# Altium integrated library Integrated_Library.IntLib: 173 symbols (part 1 of 2)
Pins are listed as number, name and electrical type; pins without a type are passive.

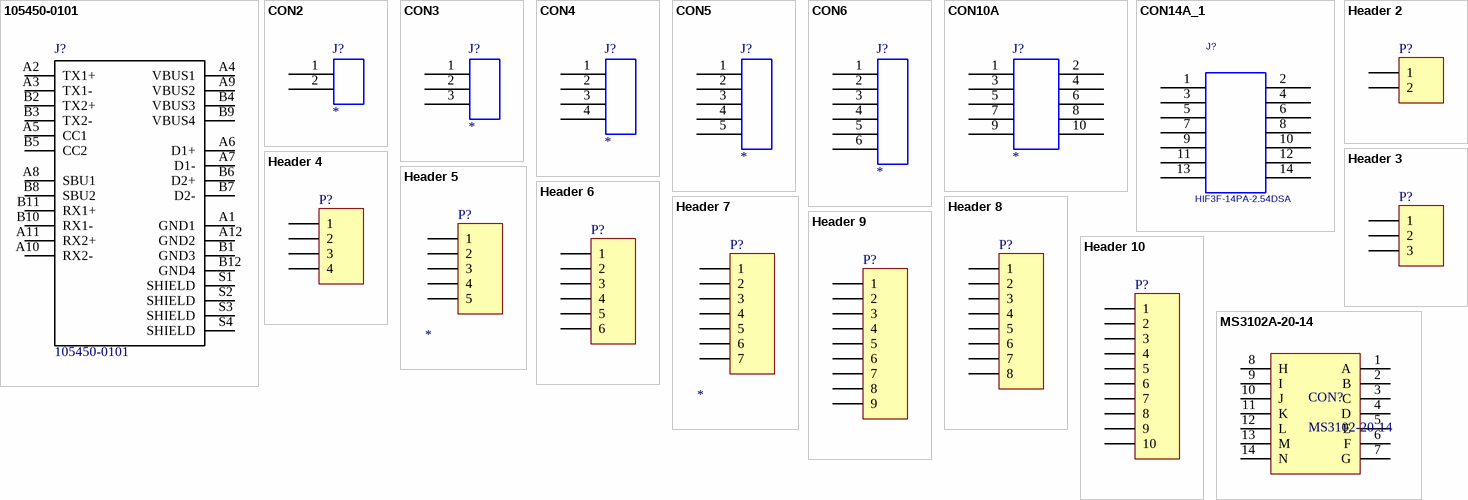
[diagram p0: symbols 105450-0101 to MS3102A-20-14]

## 105450-0101
designator J?
USB Shielded I/O Receptacle; Type C; Right Angle; Surface Mount; Gold over Nickel; MP: 1054500101; MF: Molex; Digi-Key_Purchase_URL: https://www.digikey.kr/product-detail/en/molex/1054500101/WM12856CT-ND/5843891?utm_source=snapeda&utm_medium=aggregator&utm_campaign=symbol; Package: None; SnapEDA_Link: https://www.snapeda.com/parts/1054500101/Molex/view-part/?ref=snap; Digi-Key_Part_Number: WM12856CT-ND; Value: *; Manufacturer: Molex; Part Number: 1054500101
footprint MOLEX_105450-0101_105450-0101(Primary)
pins: A1 GND1, A2 TX1+, A3 TX1-, A4 VBUS1, A5 CC1, A6 D1+, A7 D1-, A8 SBU1, A9 VBUS2, A10 RX2-, A11 RX2+, A12 GND2, B1 GND3, B2 TX2+, B3 TX2-, B4 VBUS3, B5 CC2, B6 D2+, B7 D2-, B8 SBU2, B9 VBUS4, B10 RX1-, B11 RX1+, B12 GND4, S1 SHIELD, S2 SHIELD, S3 SHIELD, S4 SHIELD

## CON2
designator J?
OriginalSymbolOrigin: (0,0)
footprint SMW250-02P
pins: 1, 2

## CON3
designator J?
OriginalSymbolOrigin: (0,0)
footprint SMW250-03P
pins: 1, 2, 3

## CON4
designator J?
OriginalSymbolOrigin: (0,0)
footprint SMW250-04P
pins: 1, 2, 3, 4

## CON5
designator J?
OriginalSymbolOrigin: (0,0)
footprint SMW250-05P
pins: 1, 2, 3, 4, 5

## CON6
designator J?
OriginalSymbolOrigin: (0,0)
footprint SMW250-06P
pins: 1, 2, 3, 4, 5, 6

## CON10A
designator J?
OriginalSymbolOrigin: (0,0)
footprint HIF3F-10PA-2.54DSA
pins: 1, 2, 3, 4, 5, 6, 7, 8, 9, 10

## CON14A_1
designator J?, comment HIF3F-14PA-2.54DSA
OriginalSymbolOrigin: (0,0)
footprint HIF3F-14PA-2.54DSA
pins: 1, 2, 3, 4, 5, 6, 7, 8, 9, 10, 11, 12, 13, 14

## Header 2
designator P?
Header, 2-Pin; LatestRevisionDate: 17-Jul-2002; LatestRevisionNote: Re-released for DXP Platform.; Publisher: Altium Limited; Part Number: *; Manufacturer: *
footprint HDR1X2 (Connector; Header; 2 Position)
signal-integrity model Connector
footprint SMW 250-02P
pins: 1, 2

## Header 3
designator P?
Header, 3-Pin; LatestRevisionDate: 17-Jul-2002; LatestRevisionNote: Re-released for DXP Platform.; Publisher: Altium Limited; Part Number: *; Manufacturer: *
footprint HDR1X3 (Connector; Header; 3 Position)
signal-integrity model Connector
footprint SMW 250-03P
pins: 1, 2, 3

## Header 4
designator P?
Header, 4-Pin; LatestRevisionDate: 17-Jul-2002; LatestRevisionNote: Re-released for DXP Platform.; Publisher: Altium Limited; Part Number: *; Manufacturer: *
footprint HDR1X4 (Connector; Header; 4 Position)
signal-integrity model Connector
footprint SMW 250-04P
pins: 1, 2, 3, 4

## Header 5
designator P?
Header, 5-Pin; LatestRevisionDate: 17-Jul-2002; LatestRevisionNote: Re-released for DXP Platform.; Publisher: Altium Limited; Part Number: *; Manufacturer: *
footprint HDR1X5 (Connector; Header; 5 Position)
signal-integrity model Connector
pins: 1, 2, 3, 4, 5

## Header 6
designator P?
Header, 6-Pin; LatestRevisionDate: 17-Jul-2002; LatestRevisionNote: Re-released for DXP Platform.; Publisher: Altium Limited; Part Number: *; Manufacturer: *
footprint HDR1X6 (Connector; Header; 6 Position)
signal-integrity model Connector
pins: 1, 2, 3, 4, 5, 6

## Header 7
designator P?
Header, 7-Pin; LatestRevisionDate: 17-Jul-2002; LatestRevisionNote: Re-released for DXP Platform.; Publisher: Altium Limited; Part Number: *; Manufacturer: *
footprint HDR1X7 (Connector; Header; 7 Position)
signal-integrity model Connector
pins: 1, 2, 3, 4, 5, 6, 7

## Header 8
designator P?
Header, 8-Pin; LatestRevisionDate: 17-Jul-2002; LatestRevisionNote: Re-released for DXP Platform.; Publisher: Altium Limited; Part Number: *; Manufacturer: *
footprint HDR1X8 (Connector; Header; 8 Position)
signal-integrity model Connector
pins: 1, 2, 3, 4, 5, 6, 7, 8

## Header 9
designator P?
Header, 9-Pin; LatestRevisionDate: 17-Jul-2002; LatestRevisionNote: Re-released for DXP Platform.; Publisher: Altium Limited; Part Number: *; Manufacturer: *
footprint HDR1X9 (Connector; Header; 9 Position)
signal-integrity model Connector
pins: 1, 2, 3, 4, 5, 6, 7, 8, 9

## Header 10
designator P?
Header, 10-Pin; LatestRevisionDate: 17-Jul-2002; LatestRevisionNote: Re-released for DXP Platform.; Publisher: Altium Limited; Part Number: *; Manufacturer: *
footprint HDR1X10 (Connector; Header; 10 Position)
signal-integrity model Connector
pins: 1, 2, 3, 4, 5, 6, 7, 8, 9, 10

## MS3102A-20-14
designator CON?, comment MS3102-20-14
pins: 1 A, 2 B, 3 C, 4 D, 5 E, 6 F, 7 G, 8 H, 9 I, 10 J, 11 K, 12 L, 13 M, 14 N


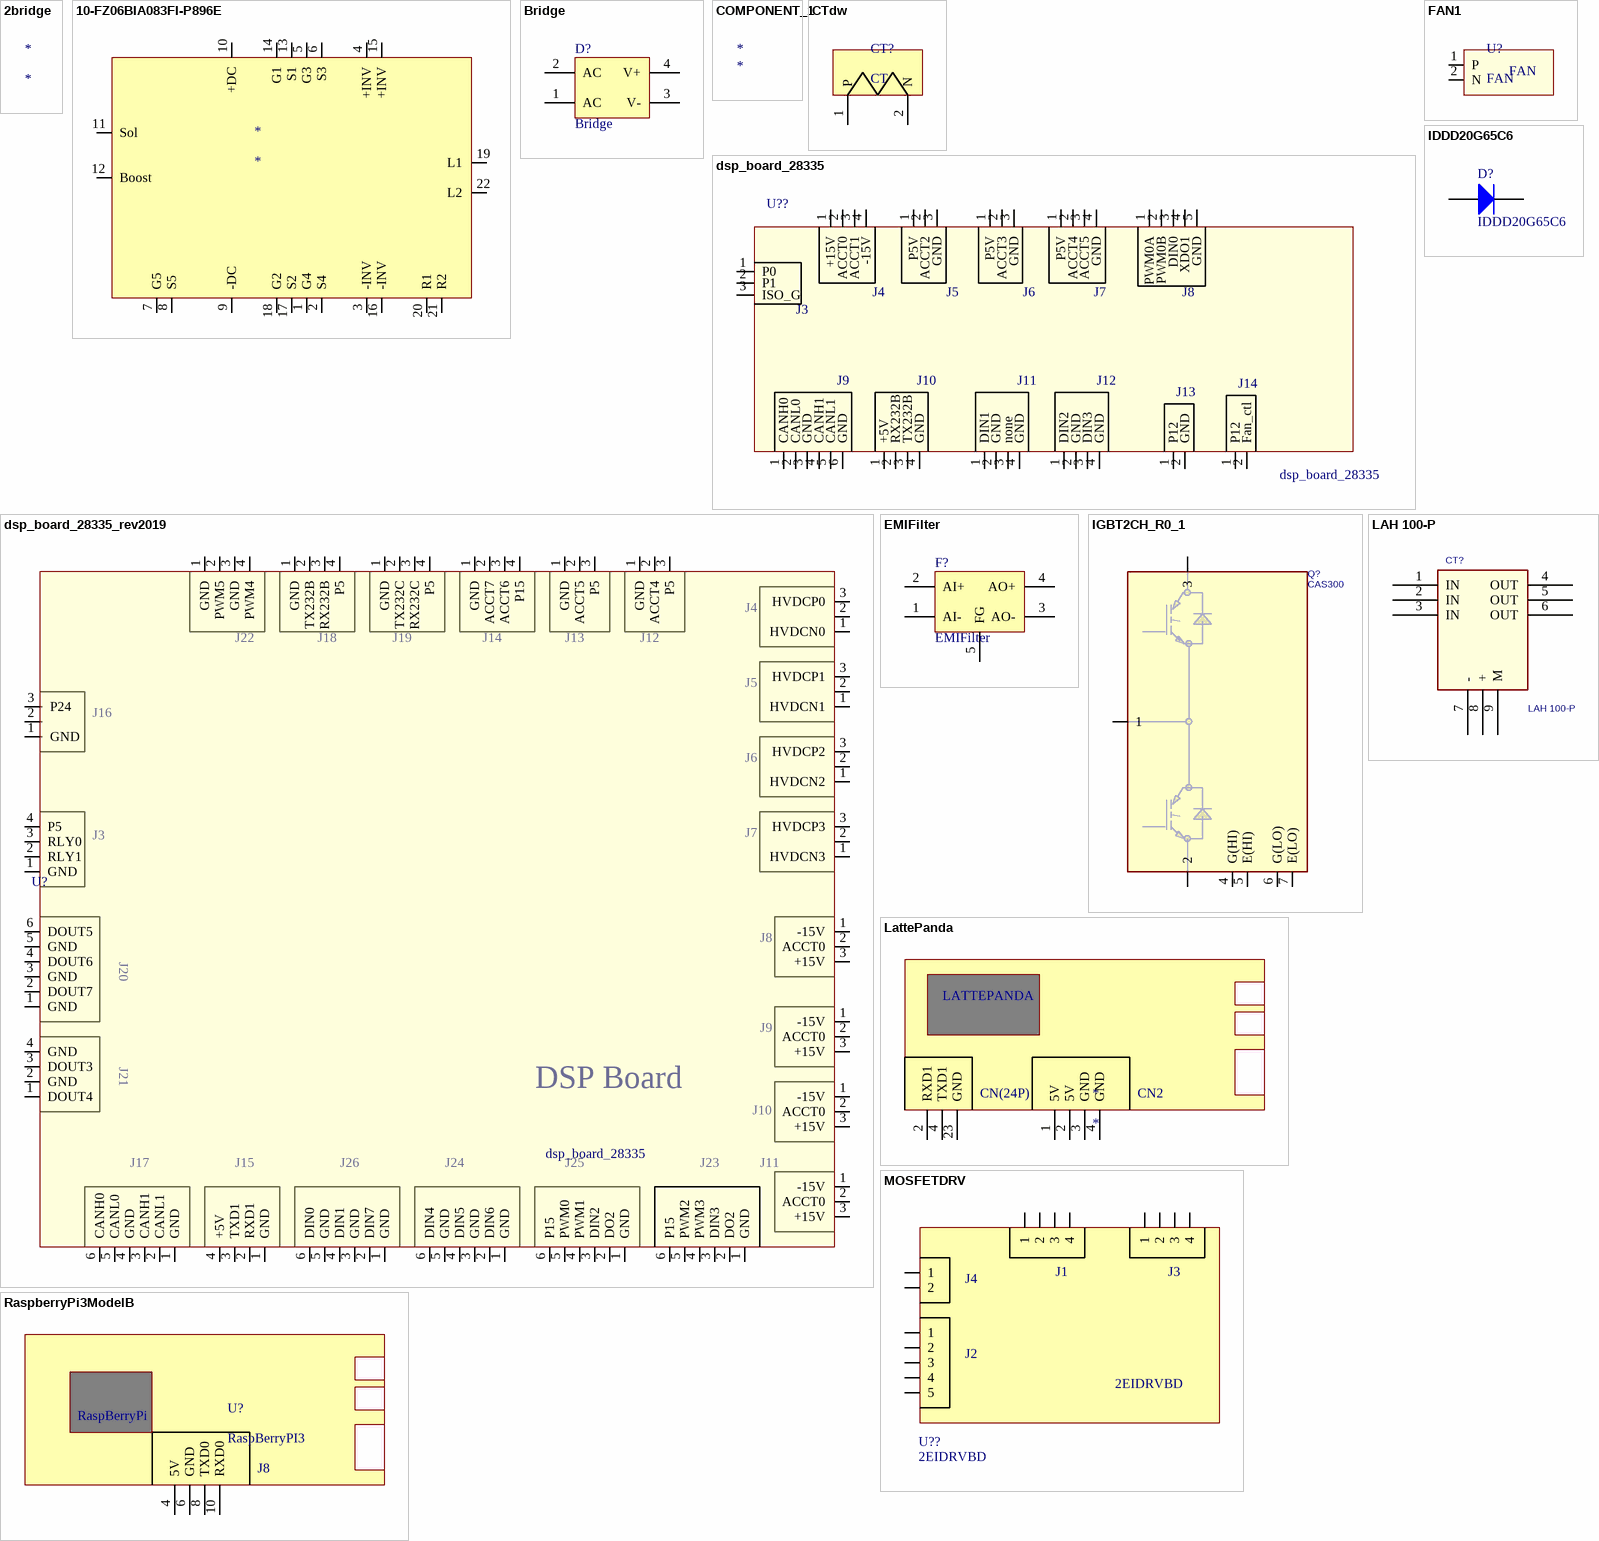
[diagram p1: symbols 2bridge to RaspberryPi3ModelB]

## 2bridge
designator *

## 10-FZ06BIA083FI-P896E
designator *
Manufacturer: Vincotech; PartNumber: 10-FZ06BIA083FI-P896E
pins: 1 G4, 2 S4, 3 -INV, 4 +INV, 5 G3, 6 S3, 7 G5, 8 S5, 9 -DC, 10 +DC, 11 Sol, 12 Boost, 13 S1, 14 G1, 15 +INV, 16 -INV, 17 S2, 18 G2, 19 L1, 20 R1, 21 R2, 22 L2

## Bridge
designator D?
Diode Bridge; Published: 24-Mar-1999; LatestRevisionDate: 17-Jul-2002; LatestRevisionNote: Re-released for DXP Platform.; PackageReference: D-46_6A; Publisher: Altium Limited; PackageDescription: Bridge Rectifier; 4 Terminals; Body 16.8 x 16.8 mm (typ); Pitch 10.67 mm
footprint D-46_6A (Bridge Rectifier; 4 Terminals; Body 16.8 x 16.8 mm (typ); Pitch 10.67 mm)
simulation model BRIDGE (Spice Subcircuit)
pins: 1 AC, 2 AC, 3 V-, 4 V+

## COMPONENT_1
designator *

## CTdw
designator CT?, comment CT
pins: 1 P, 2 N

## dsp_board_28335
designator U??
pins: 1 P5V, 1 P5V, 1 PWM0A, 1 CANH0, 1 +5V, 1 DIN1, 1 DIN2, 1 P12, 1 P12, 1 P0, 1 +15V, 1 P5V, 2 P1, 2 ACCT2, 2 ACCT3, 2 ACCT4, 2 PWM0B, 2 CANL0, 2 RX232B, 2 GND, 2 GND, 2 GND, 2 Fan_ctl, 2 ACCT0, 3 ISO_G, 3 GND, 3 ACCT5, 3 DIN0, 3 TX232B, 3 none, 3 DIN3, 3 ACCT1, 3 GND, 3 GND, 4 XDO1, 4 CANH1, 4 GND, 4 -15V, 4 GND, 4 GND, 4 GND, 5 GND, 5 CANL1, 6 GND
text: J4; J5; J6; J7; J8; J3; J9; J10; J11; J12; J14; J13

## dsp_board_28335_rev2019
designator U?, comment dsp_board_28335
by yechan; PartNumber: DSP28335_REV2019; Manufacturer: WiPowerOne
pins: 1 GND, 1 GND, 1 GND, 1 GND, 1 GND, 1 GND, 1 GND, 1 GND, 1 HVDCN0, 1 HVDCN1, 1 HVDCN2, 1 HVDCN3, 1 -15V, 1 -15V, 1 -15V, 1 -15V, 1 GND, 1 DOUT4, 1 GND, 1 GND, 1 GND, 1 GND, 1 GND, 1 GND, 2 RLY1, 2, 2 PWM5, 2 TX232B, 2 TX232C, 2 ACCT7, 2 ACCT5, 2 ACCT4, 2, 2, 2, 2, 2 ACCT0, 2 ACCT0, 2 ACCT0, 2 ACCT0, 2 DOUT7, 2 GND, 2 CANL1, 2 RXD1, 2 DIN7, 2 DIN6, 2 DO2, 2 DO2, 3 RLY0, 3 P24, 3 GND, 3 RX232B, 3 RX232C, 3 ACCT6, 3 P5, 3 P5, 3 HVDCP0, 3 HVDCP1, 3 HVDCP2, 3 HVDCP3, 3 +15V, 3 +15V, 3 +15V, 3 +15V, 3 GND, 3 DOUT3, 3 CANH1, 3 TXD1, 3 GND, 3 GND, 3 DIN2, 3 DIN3, 4 P5, 4 PWM4, 4 P5, 4 P5, 4 P15, 4 DOUT6, 4 GND, 4 GND, 4 +5V, 4 DIN1, 4 DIN5, 4 PWM1, 4 PWM3, 5 GND, 5 CANL0, 5 GND, 5 GND, 5 PWM0, 5 PWM2, 6 DOUT5, 6 CANH0, 6 DIN0, 6 DIN4, 6 P15, 6 P15
text: J4; J22; J18; J19; J14; J13; J12; J5; J16; J6; J3; J7; J8; J20; J9; J21; DSP Board; J10; J17; J15; J26; J24; J25; J23; J11

## EMIFilter
designator F?
Diode Bridge; Published: 24-Mar-1999; LatestRevisionDate: 17-Jul-2002; LatestRevisionNote: Re-released for DXP Platform.; PackageReference: D-46_6A; Publisher: Altium Limited; PackageDescription: Bridge Rectifier; 4 Terminals; Body 16.8 x 16.8 mm (typ); Pitch 10.67 mm
footprint D-46_6A (Bridge Rectifier; 4 Terminals; Body 16.8 x 16.8 mm (typ); Pitch 10.67 mm)
simulation model BRIDGE (Spice Subcircuit)
pins: 1 AI-, 2 AI+, 3 AO-, 4 AO+, 5 FG

## FAN1
designator U?, comment FAN
Manufacturer: *; Part Number: *
pins: 1 P, 2 N

## IDDD20G65C6
designator D?
Default Diode; Published: 8-Jun-2000; LatestRevisionDate: 17-Jul-2002; LatestRevisionNote: Re-released for DXP Platform.; PackageVersion: Sep-1996; PackageReference: PG-HDSOP-10; Publisher: Altium Limited; PackageDescription: PG-HDSOP-10
simulation model DIODE (Diode)
signal-integrity model Diode
footprint PG-HDSOP-10
pins: 3 A, 6 K

## IGBT2CH_R0_1
designator Q?, comment CAS300
Manufacturer: CREE; Part Number: CAS300M12BM2
footprint CAS300
pins: 1, 2, 3, 4 G(HI), 5 E(HI), 6 G(LO), 7 E(LO)

## LAH 100-P
designator CT?
footprint LAH_100
pins: 1 IN, 2 IN, 3 IN, 4 OUT, 5 OUT, 6 OUT, 7 -, 8 +, 9 M

## LattePanda
designator *
pins: 1 5V, 2 5V, 2 RXD1, 3 GND, 4 GND, 4 TXD1, 23 GND
text: LATTEPANDA; CN(24P); CN2

## MOSFETDRV
designator U??, comment 2EIDRVBD
pins: J4-1 1, J4-1 2, J4-1 3, J4-1 1, J4-1 2, J4-1 1, J4-1 2, J4-1 3, J4-1 4, J4-1 5, J4-1 1, J4-1 2, J4-1 3, J4-1 4, J4-1 4
text: J1; J3; J4; J2

## RaspberryPi3ModelB
designator U?, comment RaspBerryPI3
pins: 4 5V, 6 GND, 8 TXD0, 10 RXD0
text: RaspBerryPi; J8

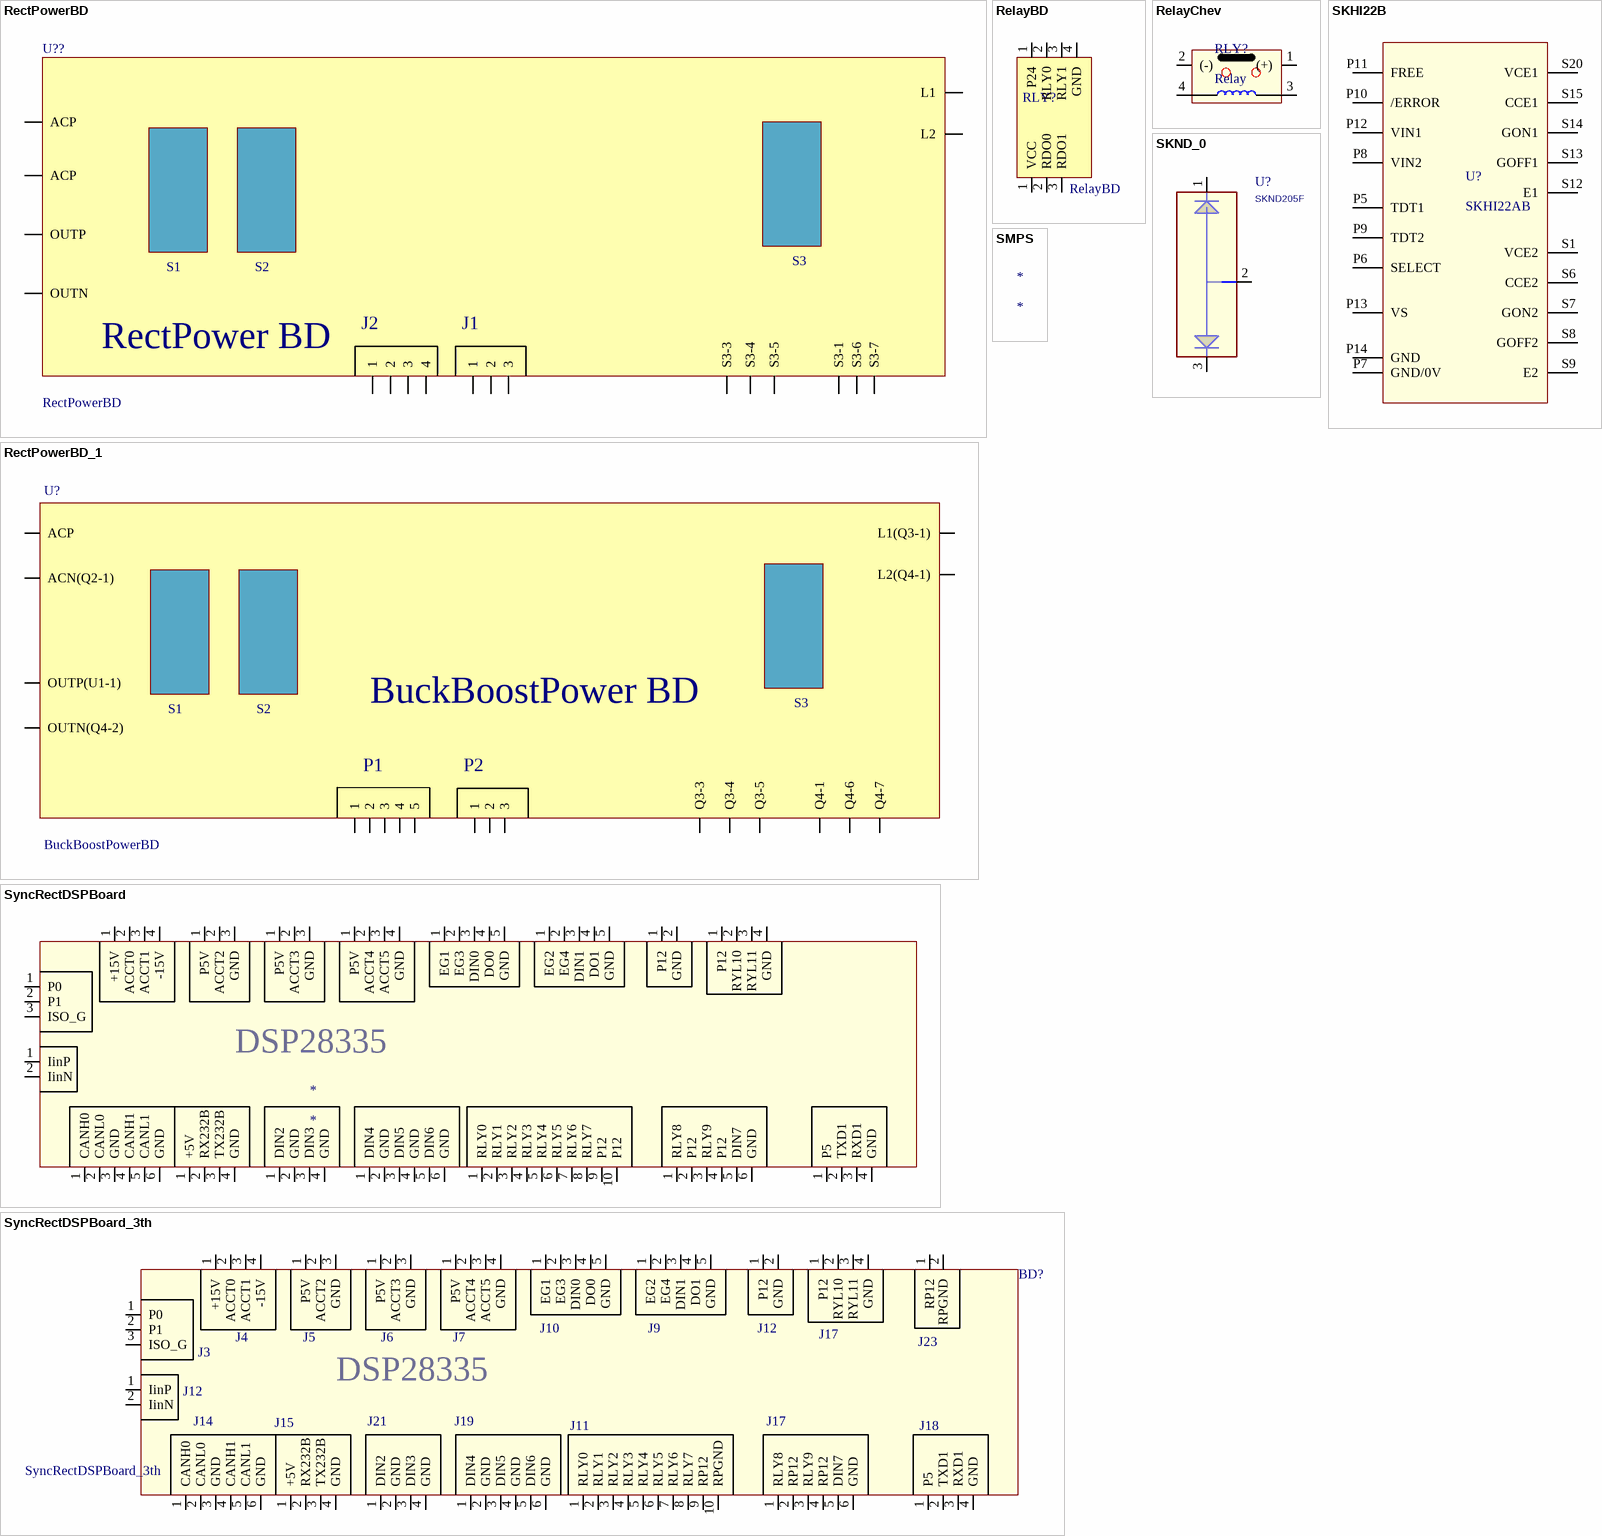
[diagram p2: symbols RectPowerBD to SyncRectDSPBoard_3th]

## RectPowerBD
designator U??
pins: ACP, ACP, L1, L2, OUTN, OUTP, S3-1, S3-3, S3-3 1, S3-3 2, S3-3 3, S3-3 4, S3-3 1, S3-3 2, S3-3 3, S3-4, S3-5, S3-6, S3-7
text: S3; S1; S2; J2; J1; RectPower BD

## RectPowerBD_1
designator U?, comment BuckBoostPowerBD
Manufacturer: WiPowerOne; PartNumber: BuckBoostPowerBD
pins: ACN ACN(Q2-1), ACP, L1 L1(Q3-1), L2 L2(Q4-1), OUTN OUTN(Q4-2), OUTP OUTP(U1-1), P1-1 1, P1-2 2, P1-3 3, P1-4 4, P1-5 5, P2-1 1, P2-2 2, P2-3 3, S3-1 Q4-1, S3-3 Q3-3, S3-4 Q3-4, S3-5 Q3-5, S3-6 Q4-6, S3-7 Q4-7
text: BuckBoostPower BD; S3; S1; S2; P1; P2

## RelayBD
designator RLY?
Manufacturer: WiPowerOne; PartNumber: LM74BTP
pins: 1 VCC, 1 P24, 2 RDO0, 2 RLY0, 3 RDO1, 3 RLY1, 4 GND

## RelayChev
designator RLY?, comment Relay
Manufacturer: *; Part Number: *
pins: 1 (+), 2 (-), 3, 4

## SKHI22B
designator U?, comment SKHI22AB
Manufacturer: SEMIKRON; ModelNumber: SKHI22AB
footprint SKHI22AB
pins: P5 TDT1, P6 SELECT, P7 GND/0V, P8 VIN2, P9 TDT2, P10 /ERROR, P11 FREE, P12 VIN1, P13 VS, P14 GND, S1 VCE2, S6 CCE2, S7 GON2, S8 GOFF2, S9 E2, S12 E1, S13 GOFF1, S14 GON1, S15 CCE1, S20 VCE1

## SKND_0
designator U?, comment SKND205F
Manufacturer: SEMIKRON; Part Number: SKND 205F06
footprint SKND205F
pins: 1 C_1, 2 COM, 3 C_2

## SMPS
designator *

## SyncRectDSPBoard
designator *
pins: 1 +15V, 1 P5V, 1 P5V, 1 P5V, 1 EG1, 1 CANH0, 1 +5V, 1 DIN2, 1 DIN4, 1 RLY0, 1 P0, 1 EG2, 1 IinP, 1 RLY8, 1 P5, 1 P12, 1 P12, 2 ACCT0, 2 ACCT2, 2 ACCT3, 2 ACCT4, 2 EG3, 2 CANL0, 2 RX232B, 2 GND, 2 GND, 2 P1, 2 EG4, 2 IinN, 2 RLY1, 2 P12, 2 TXD1, 2 GND, 2 RYL10, 3 ACCT1, 3 GND, 3 GND, 3 ACCT5, 3 DIN0, 3 GND, 3 TX232B, 3 DIN3, 3 DIN5, 3 ISO_G, 3 DIN1, 3 RLY2, 3 RLY9, 3 RXD1, 3 RYL11, 4 -15V, 4 GND, 4 DO0, 4 CANH1, 4 GND, 4 GND, 4 GND, 4 DO1, 4 RLY3, 4 P12, 4 GND, 4 GND, 5 GND, 5 CANL1, 5 GND, 5 DIN6, 5 RLY4, 5 DIN7, 6 GND, 6 GND, 6 RLY5, 6 GND, 7 RLY6, 8 RLY7, 9 P12, 10 P12
text: DSP28335

## SyncRectDSPBoard_3th
designator BD?
pins: 1 +15V, 1 P5V, 1 P5V, 1 P5V, 1 EG1, 1 CANH0, 1 +5V, 1 DIN2, 1 DIN4, 1 RLY0, 1 P0, 1 EG2, 1 IinP, 1 RLY8, 1 P5, 1 P12, 1 P12, 1 RP12, 2 ACCT0, 2 ACCT2, 2 ACCT3, 2 ACCT4, 2 EG3, 2 CANL0, 2 RX232B, 2 GND, 2 GND, 2 P1, 2 EG4, 2 IinN, 2 RLY1, 2 RP12, 2 TXD1, 2 GND, 2 RYL10, 2 RPGND, 3 ACCT1, 3 GND, 3 GND, 3 ACCT5, 3 DIN0, 3 GND, 3 TX232B, 3 DIN3, 3 DIN5, 3 ISO_G, 3 DIN1, 3 RLY2, 3 RLY9, 3 RXD1, 3 RYL11, 4 -15V, 4 GND, 4 DO0, 4 CANH1, 4 GND, 4 GND, 4 GND, 4 DO1, 4 RLY3, 4 RP12, 4 GND, 4 GND, 5 GND, 5 CANL1, 5 GND, 5 DIN6, 5 RLY4, 5 DIN7, 6 GND, 6 GND, 6 RLY5, 6 GND, 7 RLY6, 8 RLY7, 9 RP12, 10 RPGND
text: J10; J9; J12; J4; J5; J6; J7; J17; J23; J3; DSP28335; J14; J21; J19; J15; J11; J18

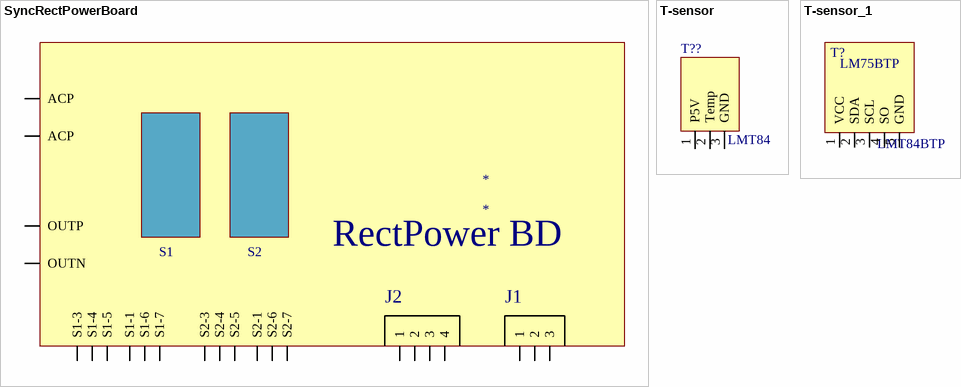
[diagram p3: symbols SyncRectPowerBoard to T-sensor_1]

## SyncRectPowerBoard
designator *
pins: ACP, ACP, OUTN, OUTP, S3-1 S2-1, S3-1 S1-1, S3-3 S2-3, S3-3 1, S3-3 2, S3-3 3, S3-3 4, S3-3 1, S3-3 2, S3-3 3, S3-3 S1-3, S3-4 S2-4, S3-4 S1-4, S3-5 S2-5, S3-5 S1-5, S3-6 S2-6, S3-6 S1-6, S3-7 S2-7, S3-7 S1-7
text: RectPower BD; S1; S2; J2; J1

## T-sensor
designator T??, comment LMT84
pins: 1 P5V, 2 Temp, 3 GND

## T-sensor_1
designator T?, comment LMT84BTP
Manufacturer: WiPowerOne; PartNumber: LM74BTP
pins: 1 VCC, 2 SDA, 3 SCL, 4 SO, 5 GND
text: LM75BTP


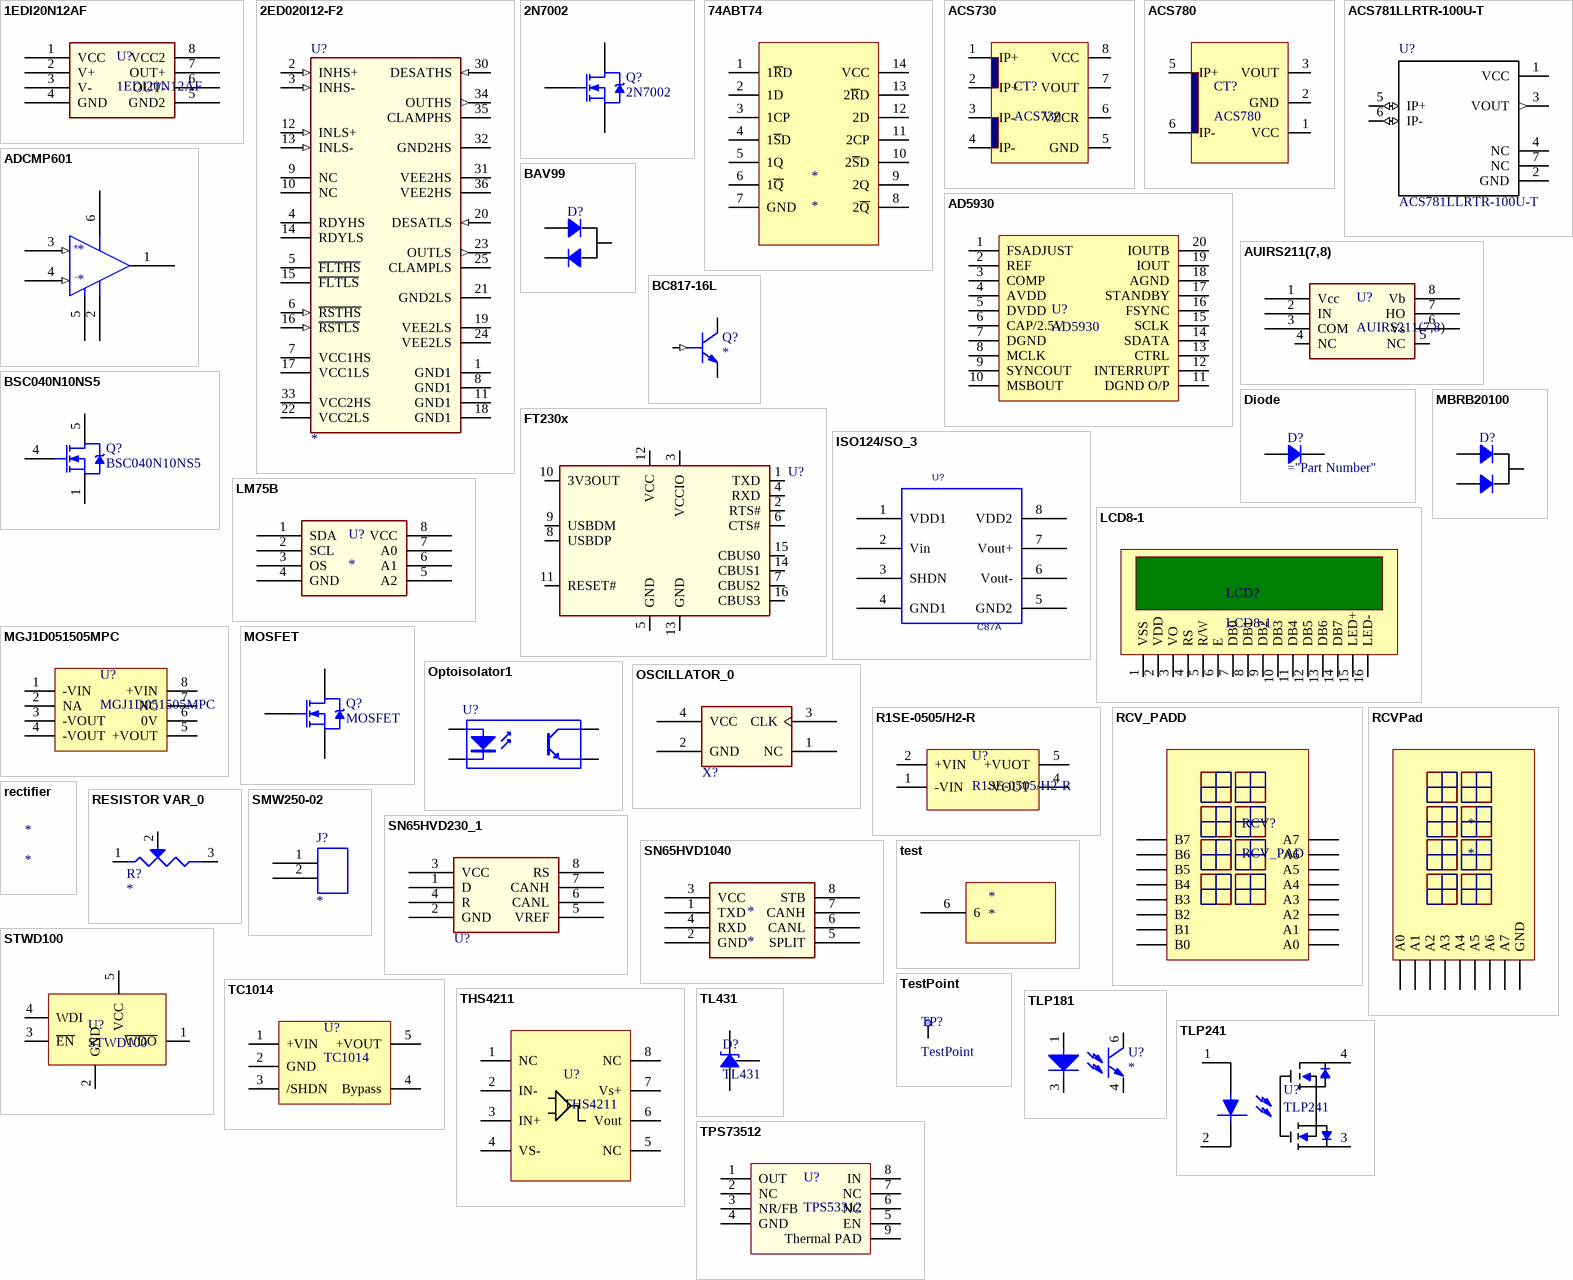
[diagram p4: symbols 1EDI20N12AF to TPS73512]

## 1EDI20N12AF
designator U?
Manufacturer: Infineon; Part Number: 1EDI20N12AF
footprint PG-DSO-8 (SOP, 8-Leads, Body 5,0x4,0mm (max), Pitch 1,27mm, IPC Medium Density)
pins: 1 VCC (power), 2 V+, 3 V-, 4 GND, 5 GND2, 6 OUT-, 7 OUT+, 8 VCC2 (power)

## 2ED020I12-F2
designator U?
footprint PG-DSO-36-58
pins: 1 GND1 (power), 2 INHS+ (in), 3 INHS- (in), 4 RDYHS (oc), 5 ~{FLTHS} (oc), 6 ~{RSTHS} (in), 7 VCC1HS (power), 8 GND1 (power), 9 NC, 10 NC, 11 GND1 (power), 12 INLS+ (in), 13 INLS- (in), 14 RDYLS (oc), 15 ~{FLTLS} (oc), 16 ~{RSTLS} (in), 17 VCC1LS (power), 18 GND1 (power), 19 VEE2LS (power), 20 DESATLS (in), 21 GND2LS (power), 22 VCC2LS (power), 23 OUTLS (out), 24 VEE2LS (power), 25 CLAMPLS, 30 DESATHS (in), 31 VEE2HS (power), 32 GND2HS (power), 33 VCC2HS (power), 34 OUTHS (out), 35 CLAMPHS, 36 VEE2HS (power)

## 2N7002
designator Q?
N-Channel Power MOSFET; Note: Pin 2 is electrically connected to pin 4.; Published: 8-Jun-2000; LatestRevisionDate: 17-Jul-2002; LatestRevisionNote: Re-released for DXP Platform.; DatasheetVersion: PD-9.814; PackageVersion: Feb-1997; PackageReference: TO-220AB; Publisher: Altium Limited; PackageDescription: TO, Thru-Hole, Vertical, Heatsink Mounted; 3 In-Line Leads; Pitch 2.54 mm; ComponentLink1Description: Manufacturer Link; ComponentLink1URL: http://www.irf.com/
footprint TO-220AB (TO, Thru-Hole, Vertical, Heatsink Mounted; 3 In-Line Leads; Pitch 2.54 mm)
simulation model IRF1010 (Spice Subcircuit)
pins: 1 G, 2 D, 3 S

## 74ABT74
designator *
pins: 1 1~{R}D, 2 1D, 3 1CP, 4 1~{S}D, 5 1Q, 6 1~{Q}, 7 GND, 8 2~{Q}, 9 2Q, 10 2~{S}D, 11 2CP, 12 2D, 13 2~{R}D, 14 VCC

## ACS730
designator CT?
Manufacturer: Allegro; ModelNumber: ACS730
footprint PG-DSO-8 (SOP, 8-Leads, Body 5,0x4,0mm (max), Pitch 1,27mm, IPC Medium Density)
pins: 1 IP+, 2 IP+, 3 IP-, 4 IP-, 5 GND, 6 VZCR, 7 VOUT, 8 VCC

## ACS780
designator CT?
Manufacturer: Allegro; ModelNumber: ACS780
pins: 1 VCC, 2 GND, 3 VOUT, 5 IP+, 6 IP-

## ACS781LLRTR-100U-T
designator U?
Thermally Enhanced Smd Current Sensor Ic; Manufacturer: Allegro; MF: Allegro MicroSystems LLC; ModelNumber: ACS781; MP: ACS781LLRTR-100U-T; Availability: Unavailable; SnapEDA_Link: https://www.snapeda.com/parts/ACS781LLRTR-100U-T/Allegro%20MicroSystems%20LLC/view-part/?ref=snap; Package: PowerSMD-7 Allegro MicroSystems LLC; Price: None; Value: *
footprint ACS781LLRTR-100U-T
pins: 1 VCC (power), 2 GND (power), 3 VOUT (out), 4 NC (power), 5 IP+ (io), 6 IP- (io), 7 NC (power)

## AD5930
designator U?
pins: 1 FSADJUST, 2 REF, 3 COMP, 4 AVDD, 5 DVDD, 6 CAP/2.5V, 7 DGND, 8 MCLK, 9 SYNCOUT, 10 MSBOUT, 11 DGND O/P, 12 INTERRUPT, 13 CTRL, 14 SDATA, 15 SCLK, 16 FSYNC, 17 STANDBY, 18 AGND, 19 IOUT, 20 IOUTB

## ADCMP601
designator *
pins: 1 Q, 2 GND (power), 3 Vp (in), 4 Vn (in), 5 LE (power), 6 VCC (power)
text: +; -

## AUIRS211(7,8)
designator U?
Manufacturer: Infineon; Part Number: AUIRS2117S
footprint SOIC127P600X175-8N (SOIC, 8-Leads, Body 4.90x3.90mm, Pitch 1.27mm, IPC Medium Density)
pins: 1 Vcc (power), 2 IN, 3 COM, 4 NC, 5 NC, 6 Vs, 7 HO, 8 Vb (power)

## BAV99
designator D?
Diode
pins: 1, 2, 3

## BC817-16L
designator Q?
footprint SOT95P245X110-3N (SOT23, 3-Leads, Body 2.90x2.45mm, Pitch 0.95mm, IPC Medium Density)
pins: 1 BASE (in), 2 EMITTER, 3 COLLECTOR

## BSC040N10NS5
designator Q?
N-Channel Power MOSFET; Note: Pin 2 is electrically connected to pin 4.; Published: 8-Jun-2000; LatestRevisionDate: 17-Jul-2002; LatestRevisionNote: Re-released for DXP Platform.; DatasheetVersion: PD-9.814; PackageVersion: Feb-1997; PackageReference: TO-220AB; Publisher: Altium Limited; PackageDescription: TO, Thru-Hole, Vertical, Heatsink Mounted; 3 In-Line Leads; Pitch 2.54 mm; ComponentLink1Description: Manufacturer Link; ComponentLink1URL: http://www.irf.com/
footprint BSC040N10NS5
simulation model IRF1010 (Spice Subcircuit)
pins: 1 S, 4 G, 5 D

## Diode
designator D?
Rectifier Diode
pins: 1, 2

## FT230x
designator U?
footprint SOP64P600X178-16N (SOP, 16-Leads, Body 4.90x3.89mm, Pitch 0.635mm, IPC Medium Density)
pins: 1 TXD, 2 RTS#, 3 VCCIO, 4 RXD, 5 GND, 6 CTS#, 7 CBUS2, 8 USBDP, 9 USBDM, 10 3V3OUT, 11 RESET#, 12 VCC, 13 GND, 14 CBUS1, 15 CBUS0, 16 CBUS3

## ISO124/SO_3
designator U?, comment C87A
OriginalSymbolOrigin: (0,0)
footprint SSO-8
pins: 1 VDD1, 2 Vin, 3 SHDN, 4 GND1, 5 GND2, 6 Vout-, 7 Vout+, 8 VDD2

## LCD8-1
designator LCD?
pins: 1 VSS, 2 VDD, 3 VO, 4 RS, 5 R/W, 6 E, 7 DB0, 8 DB1, 9 DB2, 10 DB3, 11 DB4, 12 DB5, 13 DB6, 14 DB7, 15 LED+, 16 LED-

## LM75B
designator U?
footprint SON50P300X50-8N (SON, 8-Leads, Body 2.00x3.00mm, Pitch 0.50mm, IPC Medium Density)
pins: 1 SDA (power), 2 SCL, 3 OS, 4 GND, 5 A2, 6 A1, 7 A0, 8 VCC (power)

## MBRB20100
designator D?
Diode
footprint D2PAK254P1524X470-3N (D2-PAK, 3-Pads, Body 7.60x8.36mm (max), IPC Medium Density)
pins: 1, 3, 4

## MGJ1D051505MPC
designator U?
Manufacturer: Murata; Part Number: MGJ1D051505MPC
footprint MGJ1D (Murata Power)
pins: 1 -VIN, 2 NA, 3 -VOUT, 4 -VOUT, 5 +VOUT, 6 0V, 7 NC, 8 +VIN

## MOSFET
designator Q?
N-Channel Power MOSFET; Note: Pin 2 is electrically connected to pin 4.; Published: 8-Jun-2000; LatestRevisionDate: 17-Jul-2002; LatestRevisionNote: Re-released for DXP Platform.; DatasheetVersion: PD-9.814; PackageVersion: Feb-1997; PackageReference: TO-220AB; Publisher: Altium Limited; PackageDescription: TO, Thru-Hole, Vertical, Heatsink Mounted; 3 In-Line Leads; Pitch 2.54 mm; ComponentLink1Description: Manufacturer Link; ComponentLink1URL: http://www.irf.com/
simulation model IRF1010 (Spice Subcircuit)
footprint TO-252AA(DPAK) (D-PAK, 3-Pads, Body 6.20x6.72mm (max), IPC Medium Density)
pins: 1 G, 2 D, 3 S

## Optoisolator1
designator U?
4-Pin Phototransistor Optocoupler; Published: 24-Mar-1999; LatestRevisionDate: 04-Mar-2005; LatestRevisionNote: Sch pins 3 & 4 Swapped.; DatasheetVersion: Nov-2003; PackageReference: DIP-4; Publisher: Altium Limited
footprint DIP-4 (DIP; 4 Leads; Row Spacing 7.62 mm; Pitch 2.54 mm)
pins: 1 A "Anode", 2 K "Cathode", 3 E "Emitter", 4 C "Collector"

## OSCILLATOR_0
designator X?
footprint SCO-53 (OSC, 4-Leads, Body 5.00x3.20mm, Pitch 2.54mm)
pins: 1 NC, 2 GND, 3 CLK, 4 VCC
